# Altium footprint library AD_Lib.PcbLib: 508 footprints (part 18 of 32)
Each footprint in its own frame and in the unit in brackets; x right, y up, seen from the top. Pads: shape width x height; smd on the part's side, far side on the other; paste and mask are expansions set on the pad; w line width, h text height; cw(c..) or ccw(c..) is an arc to the next point about the centre after c.
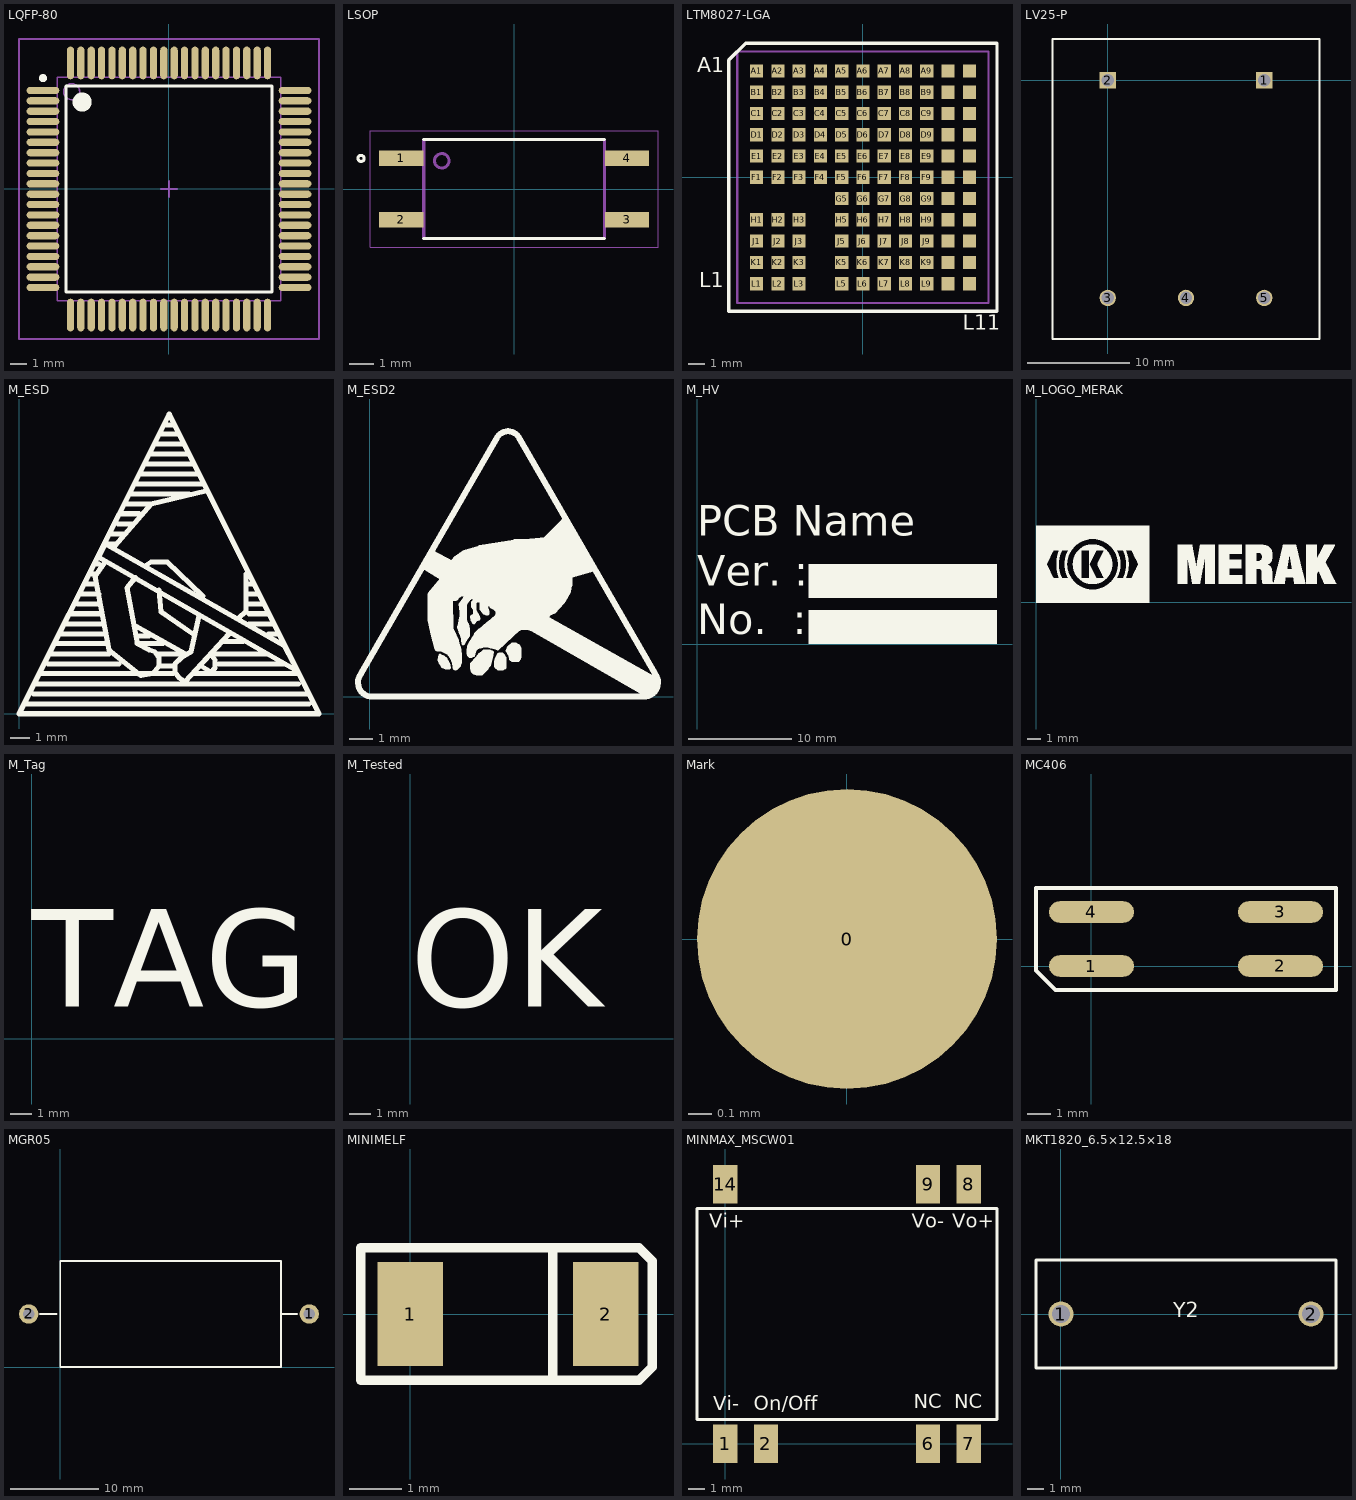
[diagram p17: the footprints below, top view; thin cyan lines are the x and y axes]

## LQFP-80 [mm] "80-Pin Thin Quad Flat Pack 0.65 mm Pitch, IPC Low Density"
height 1.6
pads (80):
  oval 2.05x0.45 smd: 1(-7.9,6.175) 2(-7.9,5.525) 3(-7.9,4.875) 4(-7.9,4.225) 5(-7.9,3.575) 6(-7.9,2.925) 7(-7.9,2.275) 8(-7.9,1.625) 9(-7.9,0.975) 10(-7.9,0.325) 11(-7.9,-0.325) 12(-7.9,-0.975) 13(-7.9,-1.625) 14(-7.9,-2.275) 15(-7.9,-2.925) 16(-7.9,-3.575) 17(-7.9,-4.225) 18(-7.9,-4.875) 19(-7.9,-5.525) 20(-7.9,-6.175) 41(7.9,-6.175) 42(7.9,-5.525) 43(7.9,-4.875) 44(7.9,-4.225) 45(7.9,-3.575) 46(7.9,-2.925) 47(7.9,-2.275) 48(7.9,-1.625) 49(7.9,-0.975) 50(7.9,-0.325) 51(7.9,0.325) 52(7.9,0.975) 53(7.9,1.625) 54(7.9,2.275) 55(7.9,2.925) 56(7.9,3.575) 57(7.9,4.225) 58(7.9,4.875) 59(7.9,5.525) 60(7.9,6.175)
  oval 0.45x2.05 smd: 21(-6.175,-7.9) 22(-5.525,-7.9) 23(-4.875,-7.9) 24(-4.225,-7.9) 25(-3.575,-7.9) 26(-2.925,-7.9) 27(-2.275,-7.9) 28(-1.625,-7.9) 29(-0.975,-7.9) 30(-0.325,-7.9) 31(0.325,-7.9) 32(0.975,-7.9) 33(1.625,-7.9) 34(2.275,-7.9) 35(2.925,-7.9) 36(3.575,-7.9) 37(4.225,-7.9) 38(4.875,-7.9) 39(5.525,-7.9) 40(6.175,-7.9) 61(6.175,7.9) 62(5.525,7.9) 63(4.875,7.9) 64(4.225,7.9) 65(3.575,7.9) 66(2.925,7.9) 67(2.275,7.9) 68(1.625,7.9) 69(0.975,7.9) 70(0.325,7.9) 71(-0.325,7.9) 72(-0.975,7.9) 73(-1.625,7.9) 74(-2.275,7.9) 75(-2.925,7.9) 76(-3.575,7.9) 77(-4.225,7.9) 78(-4.875,7.9) 79(-5.525,7.9) 80(-6.175,7.9)
Top Overlay:
  circle w0.6: c-5.45,5.45 r0.3
  circle w0.25: c-7.9,6.95 r0.125
  lines w0.2: -6.45,-6.45 6.45,-6.45 6.45,6.45 -6.45,6.45 -6.45,-6.45
Mechanical 13:
  circle w0.1: c-6.1,6.1 r0.5
  lines w0.1: -7,-7 7,-7 7,7 -7,7 -7,-7
Mechanical 15:
  lines w0.1: -0.5,0 0.5,0 ; 0,-0.5 0,0.5 ; -9.4,-9.4 9.4,-9.4 9.4,9.4 -9.4,9.4 -9.4,-9.4
3D body: height 1.6, standoff 0, extent -7,-7 7,7

## LSOP [mm] "LSOP Wide Body Package"
pads (4):
  rect 1.84x0.64 smd: 1(-4.685,1.27) 2(-4.685,-1.27) 3(4.685,-1.27) 4(4.685,1.27)
Top Overlay:
  circle w0.127: c-6.35,1.27 r0.127
  lines w0.127: -3.75,-2.05 3.75,-2.05 ; -3.75,2.05 3.75,2.05
Mechanical 13:
  circle w0.127: c-3.002,1.17 r0.3
  lines w0.127: -3.75,-2.05 -3.75,2.05 ; 3.75,-2.05 3.75,2.05
Mechanical 15:
  lines w0.05: -5.969,-2.413 5.969,-2.413 5.969,2.413 -5.969,2.413 -5.969,-2.413

## LTM8027-LGA [mil]
pads (113):
  rect 31x31 smd paste-3.5 mask-3: A1(-250,250) A2(-200,250) A3(-150,250) A4(-100,250) A5(-50,250) A6(0,250) A7(50,250) A8(100,250) A9(150,250) A10(200,250) A11(250,250) B1(-250,200) B2(-200,200) B3(-150,200) B4(-100,200) B5(-50,200) B6(0,200) B7(50,200) B8(100,200) B9(150,200) B10(200,200) B11(250,200) C1(-250,150) C2(-200,150) C3(-150,150) C4(-100,150) C5(-50,150) C6(0,150) C7(50,150) C8(100,150) C9(150,150) C10(200,150) C11(250,150) D1(-250,100) D2(-200,100) D3(-150,100) D4(-100,100) D5(-50,100) D6(0,100) D7(50,100) D8(100,100) D9(150,100) D10(200,100) D11(250,100) E1(-250,50) E2(-200,50) E3(-150,50) E4(-100,50) E5(-50,50) E6(0,50) E7(50,50) E8(100,50) E9(150,50) E10(200,50) E11(250,50) F1(-250,0) F2(-200,0) F3(-150,0) F4(-100,0) F5(-50,0) F6(0,0) F7(50,0) F8(100,0) F9(150,0) F10(200,0) F11(250,0) G5(-50,-50) G6(0,-50) G7(50,-50) G8(100,-50) G9(150,-50) G10(200,-50) G11(250,-50) H1(-250,-100) H2(-200,-100) H3(-150,-100) H5(-50,-100) H6(0,-100) H7(50,-100) H8(100,-100) H9(150,-100) H10(200,-100) H11(250,-100) J1(-250,-150) J2(-200,-150) J3(-150,-150) J5(-50,-150) J6(0,-150) J7(50,-150) J8(100,-150) J9(150,-150) J10(200,-150) J11(250,-150) K1(-250,-200) K2(-200,-200) K3(-150,-200) K5(-50,-200) K6(0,-200) K7(50,-200) K8(100,-200) K9(150,-200) K10(200,-200) K11(250,-200) L1(-250,-250) L2(-200,-250) L3(-150,-250) L5(-50,-250) L6(0,-250) L7(50,-250) L8(100,-250) L9(150,-250) L10(200,-250) L11(250,-250)
Top Overlay:
  lines w8: -314.96,-314.96 -314.96,275.59 -275.59,314.96 314.96,314.96 314.96,-314.96 -314.96,-314.96
  text "L11" at 235,-370 h60
  text "A1" at -390,235 h60
  text "L1" at -385,-270 h60
Mechanical 16:
  lines w5: -295.28,-295.28 -295.28,295.28 295.28,295.28 295.28,-295.28 -295.28,-295.28

## LV25-P [mm] "LEM 电压传感器"
height 16.45
pads (5):
  rect 1.6x1.6 hole 1.2: 1(15.24,0) 2(0,0)
  round 1.6 hole 1.2: 3(0,-21.2) 4(7.62,-21.2) 5(15.24,-21.2)
Top Overlay:
  lines w0.203: -5.38,-25.2 -5.38,4 20.62,4 20.62,-25.2 -5.38,-25.2
Bottom Overlay:
  text "VS+" at 9.525,-19.93 h2.54
  text "VS-" at 17.145,-19.93 h2.54
  text "Iout" at 1.905,-19.93 h2.54
  text "+HT" at 17.145,-2.98 h2.54
  text "-HT" at 1.905,-2.98 h2.54

## M_ESD [mm] "ESD标识，无电气意义"
Top Overlay:
  lines w0.254: 0.33,0.483 14.503,0.483 ; 0.737,0.991 14.503,0.991 ; 0.838,1.499 13.995,1.499 ; 1.016,2.007 5.994,2.007 ; 1.448,2.489 5.004,2.489 ; 1.499,2.997 4.496,2.997 ; 1.905,3.505 4.394,3.505 ; 2.083,3.988 4.216,3.988 ; 2.388,4.496 4.216,4.496 ; 2.616,5.004 4.013,5.004 ; 2.921,5.486 4.013,5.486 ; 3.099,5.994 4.013,5.994 ; 3.353,6.502 3.81,6.502 ; 3.556,6.985 3.81,6.985 ; 3.785,7.493 4.013,7.493 ; 4.216,7.468 3.81,6.883 4.496,3.2 6.096,1.905 6.706,2.007 7.01,2.388 7.01,2.794 6.807,3.099 6.502,3.2 5.918,3.505 ; 4.318,8.484 3.988,7.823 13.945,2.134 13.284,3.404 4.394,8.458 ; 4.394,8.484 4.801,8.484 ; 4.547,8.992 5.207,8.992 ; 4.699,8.306 4.801,8.407 6.604,10.49 9.347,11.151 ; 4.953,9.5 5.715,9.5 ; 5.029,10.008 5.994,10.008 ; 5.334,10.49 6.502,10.49 ; 5.512,2.007 7.696,2.007 ; 5.613,10.998 8.509,10.998 ; 5.817,4.394 8.306,2.997 ; 5.817,6.807 5.41,6.299 5.918,3.505 ; 5.893,11.506 9.195,11.506 ; 5.918,3.886 6.502,3.886 ; 6.121,11.989 8.941,11.989 ; 6.299,7.391 6.604,7.595 7.417,7.595 9.195,5.893 ; 6.325,12.497 8.636,12.497 ; 6.629,13.005 8.458,13.005 ; 6.807,13.487 8.204,13.487 ; 6.909,2.997 8.103,2.997 ; 7.01,6.198 7.112,5.105 8.712,3.988 ; 7.087,13.995 7.925,13.995 ; 7.112,2.388 7.696,2.388 ; 7.214,3.505 5.918,3.505 ; 7.315,14.453 7.645,14.453 ; 8.712,2.007 13.995,2.007 ; 9.017,4.902 8.611,3.099 8.103,2.794 7.798,2.489 7.798,2.083 8.001,1.803 8.306,1.6 10.516,3.988 ; 9.119,2.388 9.601,2.083 9.804,2.286 9.804,2.692 9.601,2.997 ; 9.703,2.997 12.395,2.997 ; 10.008,2.489 13.31,2.489 ; 10.008,2.997 12.014,2.997 ; 10.211,3.607 11.201,3.607 ; 10.998,4.801 11.354,5.105 11.354,6.985 ; 11.506,4.496 12.675,4.496 ; 11.506,5.004 12.395,5.004 ; 11.506,5.486 12.192,5.486 ; 11.506,5.994 11.887,5.994 ; 11.506,6.502 11.684,6.502 ; 12.497,3.988 13.005,3.988 ; 0,0 15.011,0 7.518,14.986 0,0

## M_ESD2 [mm] "ESD标识，无电气意义"
Top Overlay:
  drawing of 356 lines, arcs and shapes, not listed

## M_HV [mm] "PCB设计信息"
Top Overlay:
  region: 29.083,7.755 10.795,7.755 10.795,4.445 29.083,4.445
  region: 29.083,3.31 10.795,3.31 10.795,0 29.083,0
  text "Ver. :" at 0,4.699 h5
  text "No.  :" at 0,0 h5
  text "PCB Name" at 0,9.525 h5

## M_LOGO_MERAK [mm] "Merak新logo"
Top Overlay:
  drawing of 4030 lines, arcs and shapes, not listed

## M_Tag [mm] "ESD标识，无电气意义"
Top Overlay:
  text "TAG" at 0,0 h7.62

## M_Tested [mm] "ESD标识，无电气意义"
Top Overlay:
  text "OK" at 0,0 h7.62

## Mark [mm] "光学定位点"
pads (1):
  round 1.27 smd mask+1.016: 0(0,0)

## MC406 [mil] "Epson之MC406系列晶振，10.41*4.06*3.6mm"
height 142
pads (4):
  oval 142x36 smd paste-2 mask+3: 1(0,0) 2(315,0) 3(315,90) 4(0,90)
Top Overlay:
  lines w6: -92.5,-7.5 -92.5,130 407.5,130 407.5,-40 -60,-40 -92.5,-7.5

## MGR05 [mm] "米库龙之水泥电阻"
height 2.54
pads (2):
  round 2.2 hole 1.3: 1(28.194,6) 2(-3.556,6)
Top Overlay:
  lines w0.2: -2.286,6 -0.381,6 ; 25.076,6 26.797,6 ; 0,0 25,0 25,12 0,12 0,0

## MINIMELF [mm] "玻封二极管"
height 1.6
pads (2):
  rect 1.25x2 smd: 1(0,0) 2(3.75,0)
Top Overlay:
  lines w0.178: 2.734,-1.27 2.734,1.27 ; -0.949,-1.27 -0.949,1.27 4.385,1.27 4.639,1.016 4.639,-1.016 4.385,-1.27 -0.949,-1.27

## MINMAX_MSCW01 [mil] "DC/DC隔离电源模块；MSCW01之1W系列；MINMAX"
height 342.52
pads (7):
  rect 60x95 smd: 1(0,0) 2(100,0) 6(500,0) 7(600,0) 8(600,640) 9(500,640) 14(0,640)
Top Overlay:
  lines w7: -70,60 -70,580 670,580 670,60 -70,60
  text "NC" at 565,75.64 h60
  text "NC" at 465,75.64 h60
  text "On/Off" at 70,70 h60
  text "Vo+" at 560,520 h60
  text "Vo-" at 460,520 h60
  text "Vi+" at -40,520 h60
  text "Vi-" at -30,70 h60

## MKT1820_6.5×12.5×18 [mm] "Vishay之MKT1820系列电容，引脚间距=215mm，尺寸 = w × h × l"
height 12.5
pads (2):
  round 1.5 hole 1.1: 1(0,0) 2(15,0)
Top Overlay:
  lines w0.178: -1.5,-3.25 -1.5,3.25 16.5,3.25 16.5,-3.25 -1.5,-3.25
  text "Y2" at 6.738,-0.508 h1.52